# Altium footprint library Connektor.PcbLib: 305 footprints (part 16 of 20)
Each footprint in its own frame and in the unit in brackets; x right, y up, seen from the top. Pads: shape width x height; smd on the part's side, far side on the other; paste and mask are expansions set on the pad; w line width, h text height; cw(c..) or ccw(c..) is an arc to the next point about the centre after c.
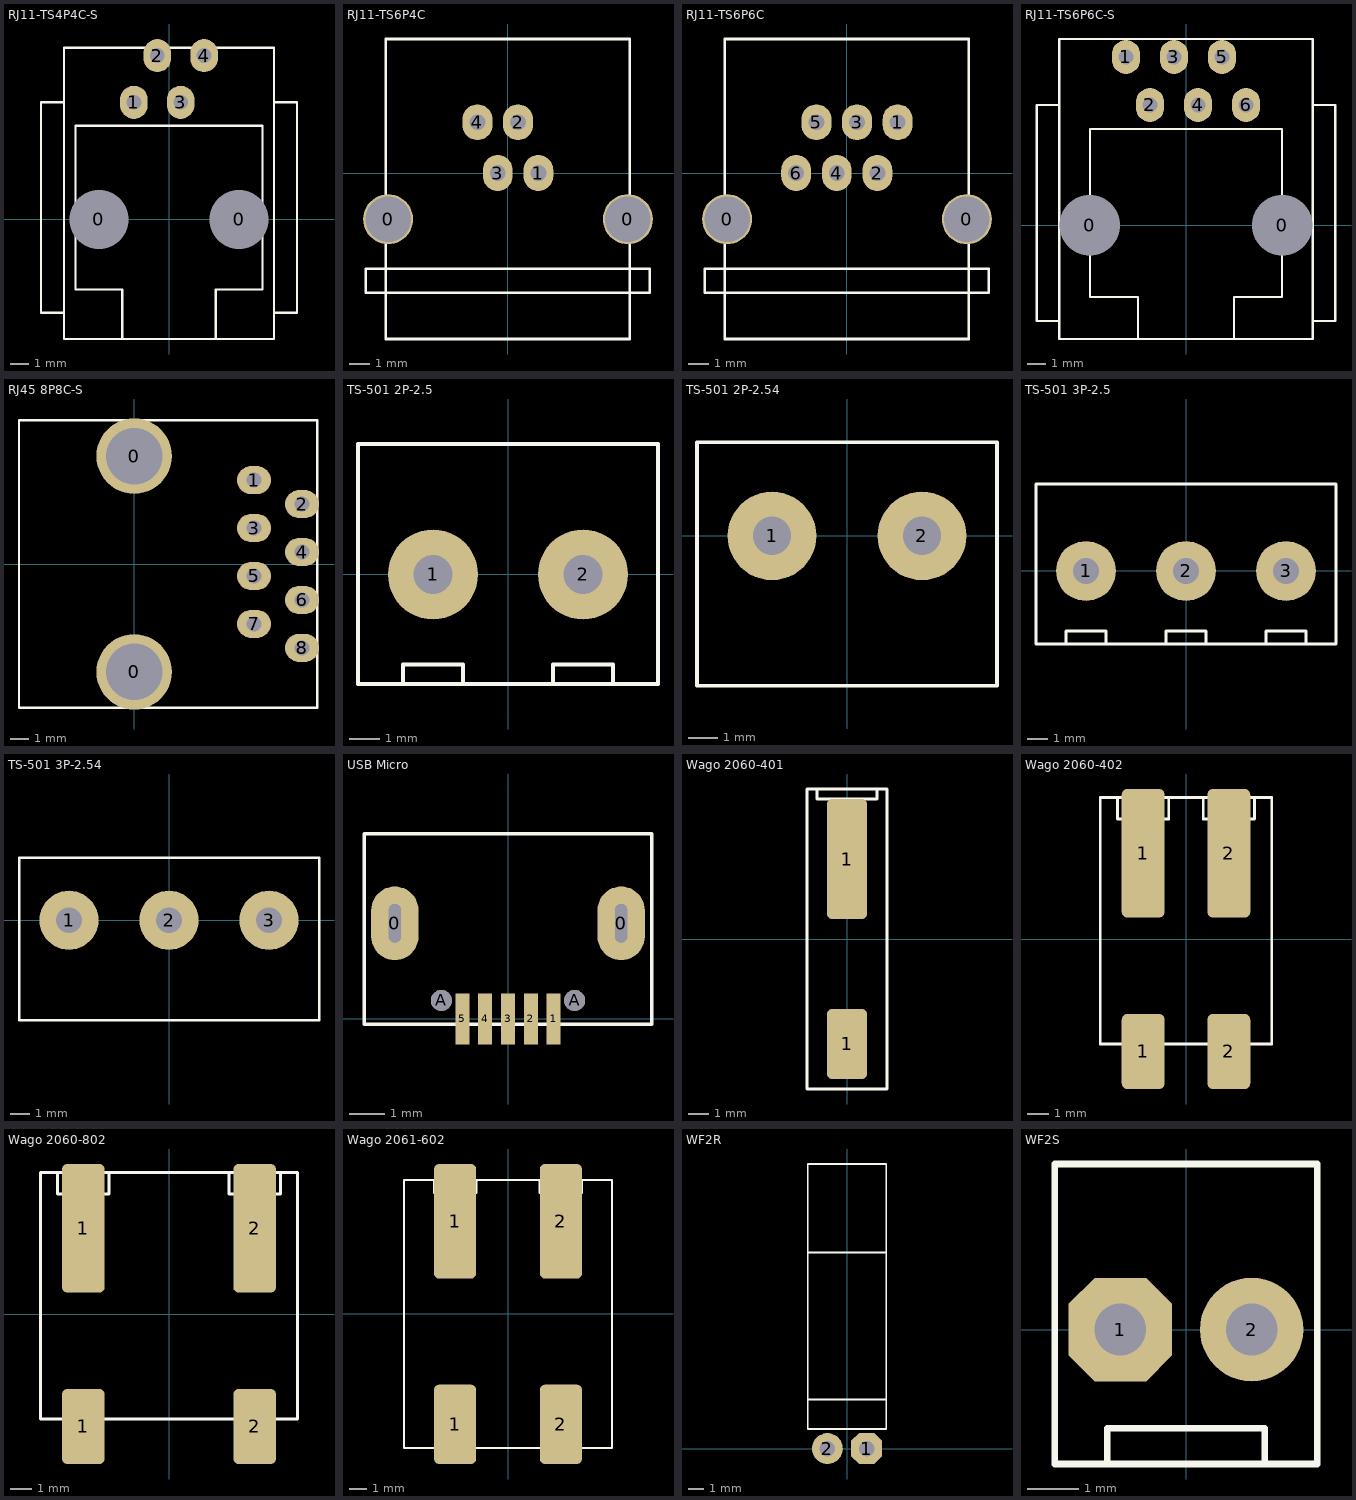
[diagram p15: the footprints below, top view; thin cyan lines are the x and y axes]

## RJ11-TS4P4C-S [mm]
pads (6):
  round 3 hole 3.2: 0(-3.81,0) 0(3.81,0)
  oval 1.5x1.8 hole 0.8: 1(-1.905,6.35) 2(-0.635,8.89) 3(0.635,6.35) 4(1.905,8.89)
TopOverlay:
  lines w0.127: -5.7,-5.08 -6.95,-5.08 -6.95,6.35 -5.7,6.35 ; -2.54,-6.5 -2.54,-3.81 -5.08,-3.81 -5.08,5.08 5.08,5.08 5.08,-3.81 2.54,-3.81 2.54,-6.5 ; 5.7,-5.08 6.95,-5.08 6.95,6.35 5.7,6.35 ; -5.7,-6.5 -5.7,9.322 5.7,9.322 5.7,-6.5 -5.7,-6.5
3D body: height 16.31, standoff -4.92, extent -6.858,-6.553 6.858,9.322

## RJ11-TS6P4C [mm]
pads (6):
  round 2.5 hole 2.286: 0(-5.986,-2.311) 0(6.013,-2.311)
  oval 1.5x1.8 hole 0.8: 1(1.532,0) 2(0.516,2.54) 3(-0.5,0) 4(-1.516,2.54)
TopOverlay:
  lines w0.127: -7.099,-5.994 7.099,-5.994 7.099,-4.801 -7.099,-4.801 -7.099,-5.994 ; -6.096,-8.306 -6.096,6.706 6.096,6.706 6.096,-8.306 -6.096,-8.306
3D body: height 14.5, standoff -3.5, extent -7.182,-8.3 7.218,4.7

## RJ11-TS6P6C [mm]
pads (8):
  round 2.5 hole 2.286: 0(-5.986,-2.311) 0(6.013,-2.311)
  oval 1.5x1.8 hole 0.8: 1(2.548,2.54) 2(1.532,0) 3(0.516,2.54) 4(-0.5,0) 5(-1.516,2.54) 6(-2.532,0)
TopOverlay:
  lines w0.127: -7.099,-5.994 -7.099,-4.801 7.099,-4.801 7.099,-5.994 -7.099,-5.994 ; -6.096,-8.306 6.096,-8.306 6.096,6.706 -6.096,6.706 -6.096,-8.306
3D body: height 14.5, standoff -3.5, extent -7.182,-8.3 7.218,4.7

## RJ11-TS6P6C-S [mm]
pads (8):
  round 3 hole 3.2: 0(-5.08,0) 0(5.08,0)
  oval 1.5x1.8 hole 0.8: 1(-3.175,8.89) 2(-1.905,6.35) 3(-0.635,8.89) 4(0.635,6.35) 5(1.905,8.89) 6(3.175,6.35)
TopOverlay:
  lines w0.127: -6.7,-5.08 -7.9,-5.08 -7.9,6.35 -6.7,6.35 ; -2.54,-6.03 -2.54,-3.81 -5.08,-3.81 -5.08,5.08 5.08,5.08 5.08,-3.81 2.54,-3.81 2.54,-6.03 ; 6.7,-5.08 7.9,-5.08 7.9,6.35 6.7,6.35 ; -6.7,-6.03 6.7,-6.03 6.7,9.84 -6.7,9.84 -6.7,-6.03
3D body: height 15.02, standoff -3.92, extent -7.875,-6.03 7.875,9.84

## RJ45 8P8C-S [mm]
pads (10):
  round 4 hole 3: 0(0,-5.715) 0(0,5.715)
  oval 1.8x1.5 hole 0.8: 1(6.35,4.445) 2(8.89,3.175) 3(6.35,1.905) 4(8.89,0.635) 5(6.35,-0.635) 6(8.89,-1.905) 7(6.35,-3.175) 8(8.89,-4.445)
TopOverlay:
  lines w0.127: -6.1,-7.62 9.7,-7.62 9.7,7.62 -6.1,7.62 -6.1,-7.62
3D body: height 16.3, standoff -3.3, extent -6.1,-7.75 9.7,7.75

## TS-501 2P-2.5 [mm]
pads (2):
  round 3 hole 1.3: 1(-2.5,0) 2(2.5,0)
TopOverlay:
  lines w0.127: -3.5,-3.65 -3.5,-3 -1.5,-3 -1.5,-3.65 ; 1.5,-3.65 1.5,-3 3.5,-3 3.5,-3.65 ; -5,-3.65 5,-3.65 5,4.35 -5,4.35 -5,-3.65
3D body: height 1.5, standoff -10.5, extent -5,-3.75 5,4.35

## TS-501 2P-2.54 [mm]
pads (2):
  round 3 hole 1.3: 1(-2.54,0) 2(2.54,0)
TopOverlay:
  lines w0.127: -5.08,-5.08 5.08,-5.08 5.08,3.175 -5.08,3.175 -5.08,-5.08
3D body: height 10, standoff -2.28, extent -5.504,-3.763 4.996,3.937

## TS-501 3P-2.5 [mm]
pads (3):
  round 3 hole 1.3: 1(-5,0) 2(0,0) 3(5,0)
TopOverlay:
  lines w0.127: -6,-3.65 -6,-3 -4,-3 -4,-3.65 ; -1,-3.65 -1,-3 1,-3 1,-3.65 ; 4,-3.65 4,-3 6,-3 6,-3.65 ; -7.5,-3.65 7.5,-3.65 7.5,4.35 -7.5,4.35 -7.5,-3.65
3D body: height 1.5, standoff -10.5, extent -7.5,-3.75 7.5,4.35

## TS-501 3P-2.54 [mm]
pads (3):
  round 3 hole 1.3: 1(-5.08,0) 2(0,0) 3(5.08,0)
TopOverlay:
  lines w0.127: -7.62,-5.08 7.62,-5.08 7.62,3.175 -7.62,3.175 -7.62,-5.08
3D body: height 10.05, standoff -2.24, extent -8.004,-3.937 7.496,3.763

## USB Micro [mm]
pads (9):
  rrect100% 1.35x2.1 hole 0.35 slot 1.1 at 90 deg: 0(-3.225,2.725) 0(3.225,2.725)
  rect 0.4x1.45 smd: 1(1.3,0) 2(0.65,0) 3(0,0) 4(-0.65,0) 5(-1.3,0)
  round 0.6 hole 0.6 unplated: A(-1.9,0.525) A(1.9,0.525)
TopOverlay:
  lines w0.1: -4.1,-0.15 4.1,-0.15 4.1,5.28 -4.1,5.28 -4.1,-0.15
3D body: height 2.68, standoff -0.63, extent -4.1,-0.15 4.1,5.28

## Wago 2060-401 [mm]
pads (2):
  rrect25% 2x3.5 smd paste-5: 1(0,-5.25)
  rrect25% 2x6 smd paste-5: 1(0,4)
TopOverlay:
  lines w0.127: -1.5,7.5 -1.5,7 1.5,7 1.5,7.5 ; -2,-7.5 2,-7.5 2,7.5 -2,7.5 -2,-7.5
TopPaste:
  rectangle: -0.9,1.2 -0.15,3.85
  rectangle: 0.15,1.2 0.9,3.85
  rectangle: -0.9,4.15 -0.15,6.8
  rectangle: 0.15,4.15 0.9,6.8
  rectangle: -0.9,-6.8 -0.15,-5.4
  rectangle: 0.15,-6.8 0.9,-5.4
  rectangle: 0.15,-5.1 0.9,-3.7
  rectangle: -0.9,-5.1 -0.15,-3.7

## Wago 2060-402 [mm]
pads (4):
  rrect25% 2x3.5 smd paste-5: 1(-2,-5.25) 2(2,-5.25)
  rrect25% 2x6 smd paste-5: 1(-2,4) 2(2,4)
TopOverlay:
  lines w0.127: -3.2,6.6 -3.2,5.6 -0.8,5.6 -0.8,6.6 ; 0.8,6.6 0.8,5.6 3.2,5.6 3.2,6.6 ; -4,-4.9 4,-4.9 4,6.6 -4,6.6 -4,-4.9
TopPaste:
  rectangle: 1.1,4.15 1.85,6.8
  rectangle: 2.15,4.15 2.9,6.8
  rectangle: -2.9,-5.1 -2.15,-3.7
  rectangle: -1.85,-5.1 -1.1,-3.7
  rectangle: -1.85,-6.8 -1.1,-5.4
  rectangle: -2.9,-6.8 -2.15,-5.4
  rectangle: 1.1,-6.8 1.85,-5.4
  rectangle: 2.15,-6.8 2.9,-5.4
  rectangle: 2.15,-5.1 2.9,-3.7
  rectangle: 1.1,-5.1 1.85,-3.7
  rectangle: -1.85,4.15 -1.1,6.8
  rectangle: -2.9,4.15 -2.15,6.8
  rectangle: -1.85,1.2 -1.1,3.85
  rectangle: -2.9,1.2 -2.15,3.85
  rectangle: 2.15,1.2 2.9,3.85
  rectangle: 1.1,1.2 1.85,3.85

## Wago 2060-802 [mm]
pads (4):
  rrect25% 2x3.5 smd paste-5: 1(-4,-5.25) 2(4,-5.25)
  rrect25% 2x6 smd paste-5: 1(-4,4) 2(4,4)
TopOverlay:
  lines w0.127: -5.2,6.6 -5.2,5.6 -2.8,5.6 -2.8,6.6 ; 2.8,6.6 2.8,5.6 5.2,5.6 5.2,6.6 ; -6,-4.9 6,-4.9 6,6.6 -6,6.6 -6,-4.9
TopPaste:
  rectangle: 3.1,4.15 3.85,6.8
  rectangle: 4.15,4.15 4.9,6.8
  rectangle: -4.9,-5.1 -4.15,-3.7
  rectangle: -3.85,-5.1 -3.1,-3.7
  rectangle: -3.85,-6.8 -3.1,-5.4
  rectangle: -4.9,-6.8 -4.15,-5.4
  rectangle: 3.1,-6.8 3.85,-5.4
  rectangle: 4.15,-6.8 4.9,-5.4
  rectangle: 4.15,-5.1 4.9,-3.7
  rectangle: 3.1,-5.1 3.85,-3.7
  rectangle: -3.85,4.15 -3.1,6.8
  rectangle: -4.9,4.15 -4.15,6.8
  rectangle: -3.85,1.2 -3.1,3.85
  rectangle: -4.9,1.2 -4.15,3.85
  rectangle: 4.15,1.2 4.9,3.85
  rectangle: 3.1,1.2 3.85,3.85

## Wago 2061-602 [mm]
pads (4):
  rrect25% 2.4x4.5 smd paste-5: 1(-3,-6.25) 2(3,-6.25)
  rrect25% 2.4x6.5 smd paste-5: 1(-3,5.25) 2(3,5.25)
TopOverlay:
  lines w0.127: -4.2,7.6 -4.2,6.85 -1.8,6.85 -1.8,7.6 ; 1.8,7.6 1.8,6.85 4.2,6.85 4.2,7.6 ; -5.9,-7.6 -5.9,7.6 5.9,7.6 5.9,-7.6 -5.9,-7.6
TopPaste:
  region: -2,8.3 -2.9,8.3 -2.9,5.4 -2,5.4
  region: -3.1,8.3 -4,8.3 -4,5.4 -3.1,5.4
  region: -2,-6.4 -2.9,-6.4 -2.9,-8.3 -2,-8.3
  region: -3.1,-6.4 -4,-6.4 -4,-8.3 -3.1,-8.3
  region: -3.1,-4.2 -4,-4.2 -4,-6.1 -3.1,-6.1
  region: -2,-4.2 -2.9,-4.2 -2.9,-6.1 -2,-6.1
  region: -3.1,5 -4,5 -4,2.2 -3.1,2.2
  region: -2,5 -2.9,5 -2.9,2.2 -2,2.2
  rectangle: 2,2.2 2.9,5
  rectangle: 3.1,2.2 4,5
  rectangle: 2,-6.1 2.9,-4.2
  rectangle: 3.1,-6.1 4,-4.2
  rectangle: 3.1,-8.3 4,-6.4
  rectangle: 2,-8.3 2.9,-6.4
  rectangle: 3.1,5.4 4,8.3
  rectangle: 2,5.4 2.9,8.3

## WF2R [mm]
pads (2):
  oct 2x2 hole 1: 1(1.27,0)
  round 2 hole 1: 2(-1.27,0)
TopOverlay:
  lines w0.127: -2.54,3.175 2.54,3.175 ; -2.54,12.7 2.54,12.7 ; -2.54,1.27 -2.54,18.415 2.54,18.415 2.54,1.27 -2.54,1.27
3D body: height 5.8, standoff -2.54, extent -2.54,-0.325 2.54,13.5

## WF2S [mm]
pads (2):
  oct 2x2 hole 1: 1(-1.27,0)
  round 2 hole 1: 2(1.27,0)
TopOverlay:
  lines w0.127: -1.524,-2.6 -1.524,-1.905 1.524,-1.905 1.524,-2.6 ; -2.54,-2.6 -2.54,3.2 2.54,3.2 2.54,-2.6 -2.54,-2.6
3D body: height 11.5, standoff -3, extent -2.54,-2.6 2.54,3.2